# Altium footprint library IC_SMD_DUAL.PCBLIB: 139 footprints (part 1 of 9)
Each footprint in its own frame and in the unit in brackets; x right, y up, seen from the top. Pads: shape width x height; smd on the part's side, far side on the other; paste and mask are expansions set on the pad; w line width, h text height; cw(c..) or ccw(c..) is an arc to the next point about the centre after c.
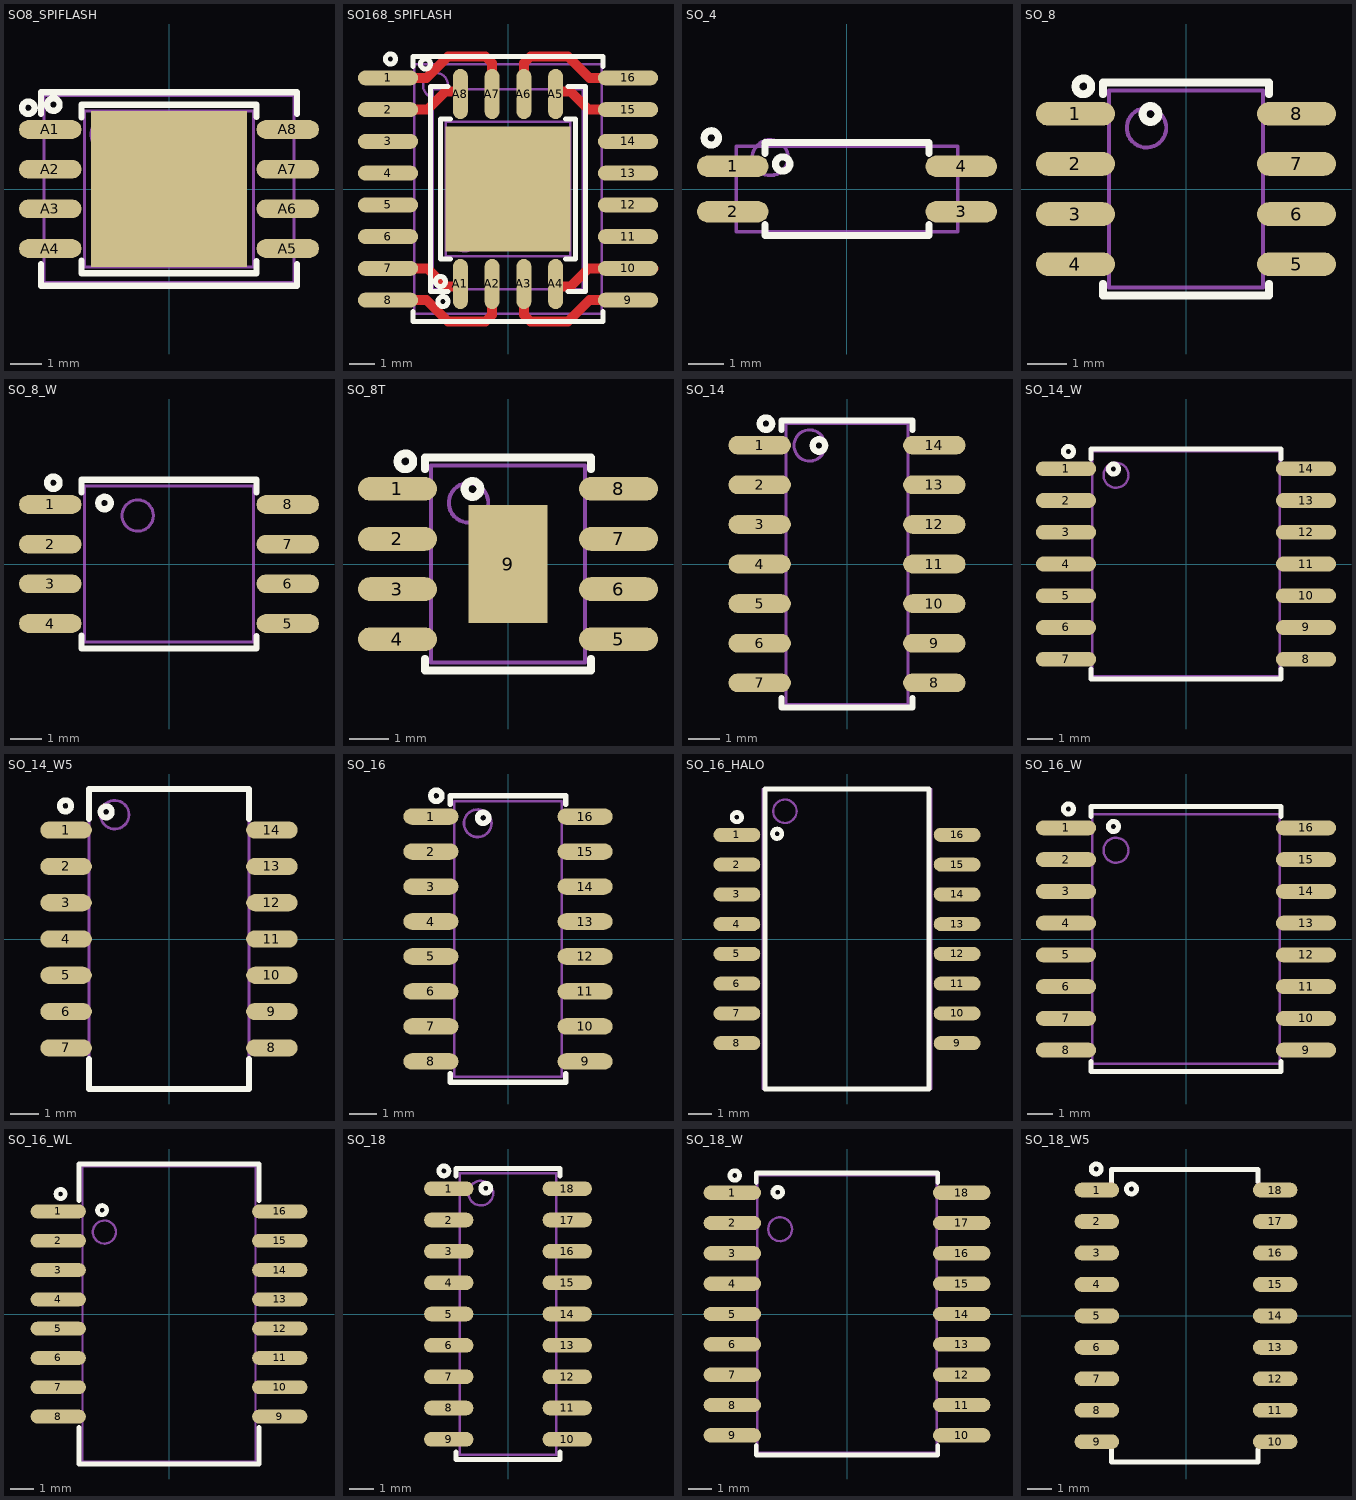
[diagram p0: the footprints below, top view; thin cyan lines are the x and y axes]

## SO8_SPIFLASH [mm]
pads (9):
  oval 2x0.6 smd: A1(-3.8,1.905) A2(-3.8,0.635) A3(-3.8,-0.635) A4(-3.8,-1.905) A5(3.8,-1.905) A6(3.8,-0.635) A7(3.8,0.635) A8(3.8,1.905)
  rect 5x5 smd: ""(0,0)
TopOverlay:
  circle w0.2: c-4.5,2.6 r0.2
  circle w0.2: c-3.7,2.7 r0.2
  lines w0.2: -4.1,-2.4 -4.1,-3.1 4.1,-3.1 4.1,-2.4 ; -4.1,2.4 -4.1,3.1 4.1,3.1 4.1,2.4 ; -2.8,-2.3 -2.8,-2.7 2.8,-2.7 2.8,-2.3 ; -2.8,2.3 -2.8,2.7 2.8,2.7 2.8,2.3
Mechanical13:
  circle w0.1: c-2,1.75 r0.5
  lines w0.1: -4,-3 -4,3 4,3 4,-3 -4,-3 ; -2.7,-2.5 -2.7,2.5 2.7,2.5 2.7,-2.5 -2.7,-2.5
3D body "User Library-SOIC8_Wide_5mmx5mm.step": height 1.75, standoff -0.01, extent -4.051,-2.73 4.05,2.73
3D body "User Library-WSON-8_6x8mm.STEP": height 0.81, standoff -0.07, extent -4,-3 4,3

## SO168_SPIFLASH [mm] "SPI FLASH, footpirnt for SOP8W+SON8W+SOP16W"
pads (25):
  oval 2.4x0.6 smd: 1(-4.8,4.445) 2(-4.8,3.175) 3(-4.8,1.905) 4(-4.8,0.635) 5(-4.8,-0.635) 6(-4.8,-1.905) 7(-4.8,-3.175) 8(-4.8,-4.445) 9(4.8,-4.445) 10(4.8,-3.175) 11(4.8,-1.905) 12(4.8,-0.635) 13(4.8,0.635) 14(4.8,1.905) 15(4.8,3.175) 16(4.8,4.445)
  oval 0.6x2 smd: A1(-1.905,-3.8) A2(-0.635,-3.8) A3(0.635,-3.8) A4(1.905,-3.8) A5(1.905,3.8) A6(0.635,3.8) A7(-0.635,3.8) A8(-1.905,3.8)
  rect 5x5 smd: ""(0,0)
TopLayer:
  lines w0.4: -4.8,-4.445 -3.255,-4.445 -2.4,-5.3 -0.9,-5.3 -0.635,-5.035 -0.635,-4 ; -4.8,-3.175 -3.225,-3.175 -2.5,-3.9 -1.905,-3.9 ; -4.8,3.175 -3.225,3.175 -2.5,3.9 -1.905,3.9 ; -4.8,4.445 -3.255,4.445 -2.4,5.3 -0.9,5.3 -0.635,5.035 -0.635,4 ; 0.635,-4 0.635,-5.035 0.9,-5.3 2.4,-5.3 3.255,-4.445 4.8,-4.445 ; 0.635,4 0.635,5.035 0.9,5.3 2.4,5.3 3.255,4.445 4.8,4.445 ; 1.905,-3.9 2.5,-3.9 3.225,-3.175 4.8,-3.175 5.825,-3.175 ; 1.905,3.9 2.5,3.9 3.225,3.175 4.8,3.175
TopOverlay:
  circle w0.2: c-2.6,-4.5 r0.2
  circle w0.2: c-2.7,-3.7 r0.2
  circle w0.2: c-4.7,5.2 r0.2
  circle w0.2: c-3.3,5 r0.2
  lines w0.2: -3.8,-4.9 -3.8,-5.3 3.8,-5.3 3.8,-4.9 ; -3.8,4.9 -3.8,5.3 3.8,5.3 3.8,4.9 ; -2.4,-4.1 -3.1,-4.1 -3.1,4.1 -2.4,4.1 ; -2.3,-2.8 -2.7,-2.8 -2.7,2.8 -2.3,2.8 ; 2.3,-2.8 2.7,-2.8 2.7,2.8 2.3,2.8 ; 2.4,-4.1 3.1,-4.1 3.1,4.1 2.4,4.1
Mechanical13:
  circle w0.1: c-1.75,-2 r0.5
  circle w0.1: c-2.9,4.15 r0.5
  lines w0.1: -3.75,-5 -3.75,5 3.75,5 3.75,-5 -3.75,-5 ; -3,-4 3,-4 3,4 -3,4 -3,-4 ; -2.5,-2.7 2.5,-2.7 2.5,2.7 -2.5,2.7 -2.5,-2.7
3D body "User Library-SOIC16_Wide_JEDEC_MS-013AA.step": height 2.62, standoff -0.03, extent -5.215,-5.25 5.415,5.25
3D body "User Library-SOIC8_Wide_5mmx5mm.step": height 1.75, standoff -0.01, extent -2.73,-4.051 2.73,4.05
3D body "User Library-WSON-8_6x8mm.STEP": height 0.81, standoff -0.07, extent -3,-4 3,4

## SO_4 [mm] "SOP-4, 2.6x4.4mm body 1.27mm pitch"
height 2.3
pads (4):
  oval 2x0.6 smd: 1(-3.2,0.635) 2(-3.2,-0.635) 3(3.2,-0.635) 4(3.2,0.635)
TopOverlay:
  circle w0.2: c-3.8,1.43 r0.2
  circle w0.2: c-1.8,0.7 r0.2
  lines w0.2: -2.3,-1 -2.3,-1.3 2.3,-1.3 2.3,-1 ; -2.3,1 -2.3,1.3 2.3,1.3 2.3,1
Mechanical13:
  circle w0.1: c-2.15,0.88 r0.5
  lines w0.1: -3.1,-1.2 3.1,-1.2 3.1,1.2 -3.1,1.2 -3.1,-1.2
3D body "CircuitWorks-TLP281.step": height 1.9, standoff 0, extent -3.5,-1.3 3.5,1.3

## SO_8 [mm] "SOP-8, 5x3.9mm body 1.27mm pitch, SOT96-1, M08A, S8, SOIC8, VO8, MS-012AA(JEDEC), R-8, 8S2, VOG8"
height 1.8
pads (8):
  oval 2x0.6 smd: 1(-2.8,1.905) 2(-2.8,0.635) 3(-2.8,-0.635) 4(-2.8,-1.905) 5(2.8,-1.905) 6(2.8,-0.635) 7(2.8,0.635) 8(2.8,1.905)
TopOverlay:
  circle w0.2: c-2.6,2.6 r0.2
  circle w0.2: c-0.9,1.9 r0.2
  lines w0.2: -2.1,-2.4 -2.1,-2.7 2.1,-2.7 2.1,-2.4 ; -2.1,2.4 -2.1,2.7 2.1,2.7 2.1,2.4
Mechanical13:
  circle w0.1: c-1,1.55 r0.5
  lines w0.1: -1.95,-2.5 1.95,-2.5 1.95,2.5 -1.95,2.5 -1.95,-2.5
3D body "User Library-so8-3.step": height 1.7, standoff 0, extent -3,-2.45 3,2.45

## SO_8_W [mm] "SOIC Width, 5x5.3mm body 0.5mm pitch, 5.28mm SOIJ"
pads (8):
  oval 2x0.6 smd: 1(-3.8,1.905) 2(-3.8,0.635) 3(-3.8,-0.635) 4(-3.8,-1.905) 5(3.8,-1.905) 6(3.8,-0.635) 7(3.8,0.635) 8(3.8,1.905)
TopOverlay:
  circle w0.2: c-3.7,2.6 r0.2
  circle w0.2: c-2.064,1.95 r0.2
  lines w0.2: -2.8,-2.3 -2.8,-2.7 2.8,-2.7 2.8,-2.3 ; -2.8,2.3 -2.8,2.7 2.8,2.7 2.8,2.3
Mechanical13:
  circle w0.1: c-1,1.55 r0.5
  lines w0.1: -2.7,-2.5 2.7,-2.5 2.7,2.5 -2.7,2.5 -2.7,-2.5
3D body "User Library-SOIC8_Wide_5mmx5mm.step": height 1.75, standoff -0.01, extent -4.051,-2.73 4.05,2.73

## SO_8T [mm] "SOP-8, 5x3.9mm body 0.5mm pitch, DDA, SO PowerPAD"
height 1.8
pads (9):
  oval 2x0.6 smd: 1(-2.8,1.905) 2(-2.8,0.635) 3(-2.8,-0.635) 4(-2.8,-1.905) 5(2.8,-1.905) 6(2.8,-0.635) 7(2.8,0.635) 8(2.8,1.905)
  rect 2x3 smd mask+0.1: 9(0,0)
TopOverlay:
  circle w0.2: c-2.6,2.6 r0.2
  circle w0.2: c-0.9,1.9 r0.2
  lines w0.2: -2.1,-2.4 -2.1,-2.7 2.1,-2.7 2.1,-2.4 ; -2.1,2.4 -2.1,2.7 2.1,2.7 2.1,2.4
Mechanical13:
  circle w0.1: c-1,1.55 r0.5
  lines w0.1: -1.95,-2.5 1.95,-2.5 1.95,2.5 -1.95,2.5 -1.95,-2.5
3D body "User Library-so8-3.step": height 1.7, standoff 0, extent -3,-2.45 3,2.45

## SO_14 [mm] "SOP, SOIC, 3.9mm width, 1.27mm pitch,"
pads (14):
  oval 2x0.6 smd: 1(-2.8,3.81) 2(-2.8,2.54) 3(-2.8,1.27) 4(-2.8,0) 5(-2.8,-1.27) 6(-2.8,-2.54) 7(-2.8,-3.81) 8(2.8,-3.81) 9(2.8,-2.54) 10(2.8,-1.27) 11(2.8,0) 12(2.8,1.27) 13(2.8,2.54) 14(2.8,3.81)
TopOverlay:
  circle w0.2: c-0.9,3.8 r0.2
  circle w0.2: c-2.6,4.5 r0.2
  lines w0.2: -2.1,-4.3 -2.1,-4.6 2.1,-4.6 2.1,-4.3 ; -2.1,4.3 -2.1,4.6 2.1,4.6 2.1,4.3
Mechanical13:
  circle w0.1: c-1.2,3.8 r0.5
  lines w0.1: -1.95,-4.5 -1.95,4.5 1.95,4.5 1.95,-4.5 -1.95,-4.5
3D body "User Library-SOIC14_JEDEC_MS-012AB.step": height 1.75, standoff -0.01, extent -3.1,-4.375 3.1,4.375

## SO_14_W [mm] "SOP, SOIC, 7.5mm width, 1.27mm pitch,"
pads (14):
  oval 2.4x0.6 smd: 1(-4.8,3.81) 2(-4.8,2.54) 3(-4.8,1.27) 4(-4.8,0) 5(-4.8,-1.27) 6(-4.8,-2.54) 7(-4.8,-3.81) 8(4.8,-3.81) 9(4.8,-2.54) 10(4.8,-1.27) 11(4.8,0) 12(4.8,1.27) 13(4.8,2.54) 14(4.8,3.81)
TopOverlay:
  circle w0.2: c-4.7,4.5 r0.2
  circle w0.2: c-2.9,3.8 r0.2
  lines w0.2: -3.8,-4.2 -3.8,-4.6 3.8,-4.6 3.8,-4.2 ; -3.8,4.2 -3.8,4.6 3.8,4.6 3.8,4.2
Mechanical13:
  circle w0.1: c-2.8,3.55 r0.5
  lines w0.1: -3.75,-4.5 -3.75,4.5 3.75,4.5 3.75,-4.5 -3.75,-4.5
3D body "User Library-SOIC14WB.STEP": height 2.67, standoff -0.04, extent -5.25,-4.5 5.25,4.5

## SO_14_W5 [mm] "SOP NS, 5.3mm width, 1.27mm pitch,"
height 2
pads (14):
  oval 1.8x0.6 smd: 1(-3.6,3.81) 2(-3.6,2.54) 3(-3.6,1.27) 4(-3.6,0) 5(-3.6,-1.27) 6(-3.6,-2.54) 7(-3.6,-3.81) 8(3.6,-3.81) 9(3.6,-2.54) 10(3.6,-1.27) 11(3.6,0) 12(3.6,1.27) 13(3.6,2.54) 14(3.6,3.81)
TopOverlay:
  circle w0.2: c-2.2,4.45 r0.2
  circle w0.2: c-3.625,4.66 r0.2
  lines w0.2: -2.8,-4.2 -2.8,-5.25 2.8,-5.25 2.8,-4.2 ; -2.8,4.2 -2.8,5.25 2.8,5.25 2.8,4.2
Mechanical13:
  circle w0.1: c-1.9,4.35 r0.5
  lines w0.1: -2.8,-5.25 2.8,-5.25 2.8,5.25 -2.8,5.25 -2.8,-5.25
3D body "SO_14_W5.step": height 2, standoff 0, extent -3.9,-5.25 3.9,5.25

## SO_16 [mm] "SOP, SOIC, 3.9mm width, 1.27mm pitch,"
pads (16):
  oval 2x0.6 smd: 1(-2.8,4.445) 2(-2.8,3.175) 3(-2.8,1.905) 4(-2.8,0.635) 5(-2.8,-0.635) 6(-2.8,-1.905) 7(-2.8,-3.175) 8(-2.8,-4.445) 9(2.8,-4.445) 10(2.8,-3.175) 11(2.8,-1.905) 12(2.8,-0.635) 13(2.8,0.635) 14(2.8,1.905) 15(2.8,3.175) 16(2.8,4.445)
TopOverlay:
  circle w0.2: c-2.6,5.2 r0.2
  circle w0.2: c-0.9,4.4 r0.2
  lines w0.2: -2.1,-4.9 -2.1,-5.2 2.1,-5.2 2.1,-4.9 ; -2.1,4.9 -2.1,5.2 2.1,5.2 2.1,4.9
Mechanical13:
  circle w0.1: c-1.1,4.2 r0.5
  lines w0.1: -1.95,-5 -1.95,5 1.95,5 1.95,-5 -1.95,-5
3D body "User Library-SOIC-16-3.step": height 1.7, standoff 0, extent -3.1,-4.953 3.098,4.953

## SO_16_HALO [mm] "16pinsoic (HALO)  pitch: 1.27mm, 12.7X7.1X5mm"
height 5
pads (16):
  oval 2x0.6 smd: 1(-4.7,4.445) 2(-4.7,3.175) 3(-4.7,1.905) 4(-4.7,0.635) 5(-4.7,-0.635) 6(-4.7,-1.905) 7(-4.7,-3.175) 8(-4.7,-4.445) 9(4.7,-4.445) 10(4.7,-3.175) 11(4.7,-1.905) 12(4.7,-0.635) 13(4.7,0.635) 14(4.7,1.905) 15(4.7,3.175) 16(4.7,4.445)
TopOverlay:
  circle w0.2: c-2.98,4.49 r0.2
  circle w0.2: c-4.7,5.2 r0.2
  lines w0.2: -3.5,-6.4 3.5,-6.4 3.5,6.4 -3.5,6.4 -3.5,-6.4
Mechanical13:
  circle w0.1: c-2.65,5.45 r0.5
  lines w0.1: -3.6,-6.4 -3.6,6.4 3.6,6.4 3.6,-6.4 -3.6,-6.4
3D body "User Library-Halo_SMD10base-T Module.step": height 5.04, standoff 0, extent -4.754,-6.35 4.763,6.35

## SO_16_W [mm] "SOP, SOIC, 7.5mm width, 1.27mm pitch,"
pads (16):
  oval 2.4x0.6 smd: 1(-4.8,4.445) 2(-4.8,3.175) 3(-4.8,1.905) 4(-4.8,0.635) 5(-4.8,-0.635) 6(-4.8,-1.905) 7(-4.8,-3.175) 8(-4.8,-4.445) 9(4.8,-4.445) 10(4.8,-3.175) 11(4.8,-1.905) 12(4.8,-0.635) 13(4.8,0.635) 14(4.8,1.905) 15(4.8,3.175) 16(4.8,4.445)
TopOverlay:
  circle w0.2: c-2.9,4.5 r0.2
  circle w0.2: c-4.7,5.2 r0.2
  lines w0.2: -3.8,-4.9 -3.8,-5.3 3.8,-5.3 3.8,-4.9 ; -3.8,4.9 -3.8,5.3 3.8,5.3 3.8,4.9
Mechanical13:
  circle w0.1: c-2.8,3.55 r0.5
  lines w0.1: -3.75,-5 3.75,-5 3.75,5 -3.75,5 -3.75,-5
3D body "User Library-SOIC16_Wide_JEDEC_MS-013AA.step": height 2.62, standoff -0.03, extent -5.215,-5.25 5.415,5.25

## SO_16_WL [mm] "SOP, SOIC, 7.5mm width, 1.27mm pitch, MS-013-AC, RI-16-2, 16-Lead"
height 1.2
pads (16):
  oval 2.4x0.6 smd: 1(-4.8,4.445) 2(-4.8,3.175) 3(-4.8,1.905) 4(-4.8,0.635) 5(-4.8,-0.635) 6(-4.8,-1.905) 7(-4.8,-3.175) 8(-4.8,-4.445) 9(4.8,-4.445) 10(4.8,-3.175) 11(4.8,-1.905) 12(4.8,-0.635) 13(4.8,0.635) 14(4.8,1.905) 15(4.8,3.175) 16(4.8,4.445)
TopOverlay:
  circle w0.2: c-4.7,5.2 r0.2
  circle w0.2: c-2.9,4.5 r0.2
  lines w0.2: -3.9,-4.9 -3.9,-6.5 3.9,-6.5 3.9,-4.9 ; -3.9,4.9 -3.9,6.5 3.9,6.5 3.9,4.9
Mechanical13:
  circle w0.1: c-2.8,3.55 r0.5
  lines w0.1: -3.75,-6.4 -3.75,6.4 3.75,6.4 3.75,-6.4 -3.75,-6.4
3D body: height 2.6, standoff 0.08, extent -3.75,5.2 3.8,6.4
3D body: height 2.6, standoff 0.08, extent -3.75,-6.4 3.8,-5.2
3D body "User Library-SOIC16_Wide_JEDEC_MS-013AA.step": height 2.62, standoff -0.03, extent -5.215,-5.25 5.415,5.25

## SO_18 [mm] "SOP, SOIC, 3.9mm width, 1.27mm pitch,"
pads (18):
  oval 2x0.6 smd: 1(-2.4,5.08) 2(-2.4,3.81) 3(-2.4,2.54) 4(-2.4,1.27) 5(-2.4,0) 6(-2.4,-1.27) 7(-2.4,-2.54) 8(-2.4,-3.81) 9(-2.4,-5.08) 10(2.4,-5.08) 11(2.4,-3.81) 12(2.4,-2.54) 13(2.4,-1.27) 14(2.4,0) 15(2.4,1.27) 16(2.4,2.54) 17(2.4,3.81) 18(2.4,5.08)
TopOverlay:
  circle w0.2: c-0.9,5.1 r0.2
  circle w0.2: c-2.6,5.8 r0.2
  lines w0.2: -2.1,-5.6 -2.1,-5.9 2.1,-5.9 2.1,-5.6 ; -2.1,5.6 -2.1,5.9 2.1,5.9 2.1,5.6
Mechanical13:
  circle w0.1: c-1.1,4.9 r0.5
  lines w0.1: -1.95,-5.7 1.95,-5.7 1.95,5.7 -1.95,5.7 -1.95,-5.7
3D body "SOIC127P600-8N.step": height 2, standoff 0, extent -3.1,-5.75 3.1,5.75

## SO_18_W [mm] "SOP, SOIC, 7.5mm width, 1.27mm pitch,"
pads (18):
  oval 2.4x0.6 smd: 1(-4.8,5.08) 2(-4.8,3.81) 3(-4.8,2.54) 4(-4.8,1.27) 5(-4.8,0) 6(-4.8,-1.27) 7(-4.8,-2.54) 8(-4.8,-3.81) 9(-4.8,-5.08) 10(4.8,-5.08) 11(4.8,-3.81) 12(4.8,-2.54) 13(4.8,-1.27) 14(4.8,0) 15(4.8,1.27) 16(4.8,2.54) 17(4.8,3.81) 18(4.8,5.08)
TopOverlay:
  circle w0.2: c-2.9,5.1 r0.2
  circle w0.2: c-4.7,5.8 r0.2
  lines w0.2: -3.8,-5.5 -3.8,-5.9 3.8,-5.9 3.8,-5.5 ; -3.8,5.5 -3.8,5.9 3.8,5.9 3.8,5.5
Mechanical13:
  circle w0.1: c-2.8,3.55 r0.5
  lines w0.1: -3.75,-5.8 3.75,-5.8 3.75,5.8 -3.75,5.8 -3.75,-5.8
3D body "User Library-SOIC18-300.step": height 2.65, standoff 0, extent -5.15,-5.765 5.15,5.765

## SO_18_W5 [mm] "SOP-18, 5.4mm width, 1.27mm pitch,"
pads (18):
  oval 1.8x0.6 smd: 1(-3.6,5.08) 2(-3.6,3.81) 3(-3.6,2.54) 4(-3.6,1.27) 5(-3.6,0) 6(-3.6,-1.27) 7(-3.6,-2.54) 8(-3.6,-3.81) 9(-3.6,-5.08) 10(3.6,-5.08) 11(3.6,-3.81) 12(3.6,-2.54) 13(3.6,-1.27) 14(3.6,0) 15(3.6,1.27) 16(3.6,2.54) 17(3.6,3.81) 18(3.6,5.08)
TopOverlay:
  circle w0.2: c-3.625,5.93 r0.2
  circle w0.2: c-2.2,5.12 r0.2
  lines w0.2: -3,-5.4 -3,-5.9 2.9,-5.9 2.9,-5.4 ; -3,5.4 -3,5.9 2.9,5.9 2.9,5.4
3D body "SO_18_W55.step": height 2, standoff 0, extent -3.9,-5.8 3.9,5.8